# Altium footprint library PCBKU.PcbLib: 192 footprints (part 5 of 12)
Each footprint in its own frame and in the unit in brackets; x right, y up, seen from the top. Pads: shape width x height; smd on the part's side, far side on the other; paste and mask are expansions set on the pad; w line width, h text height; cw(c..) or ccw(c..) is an arc to the next point about the centre after c.
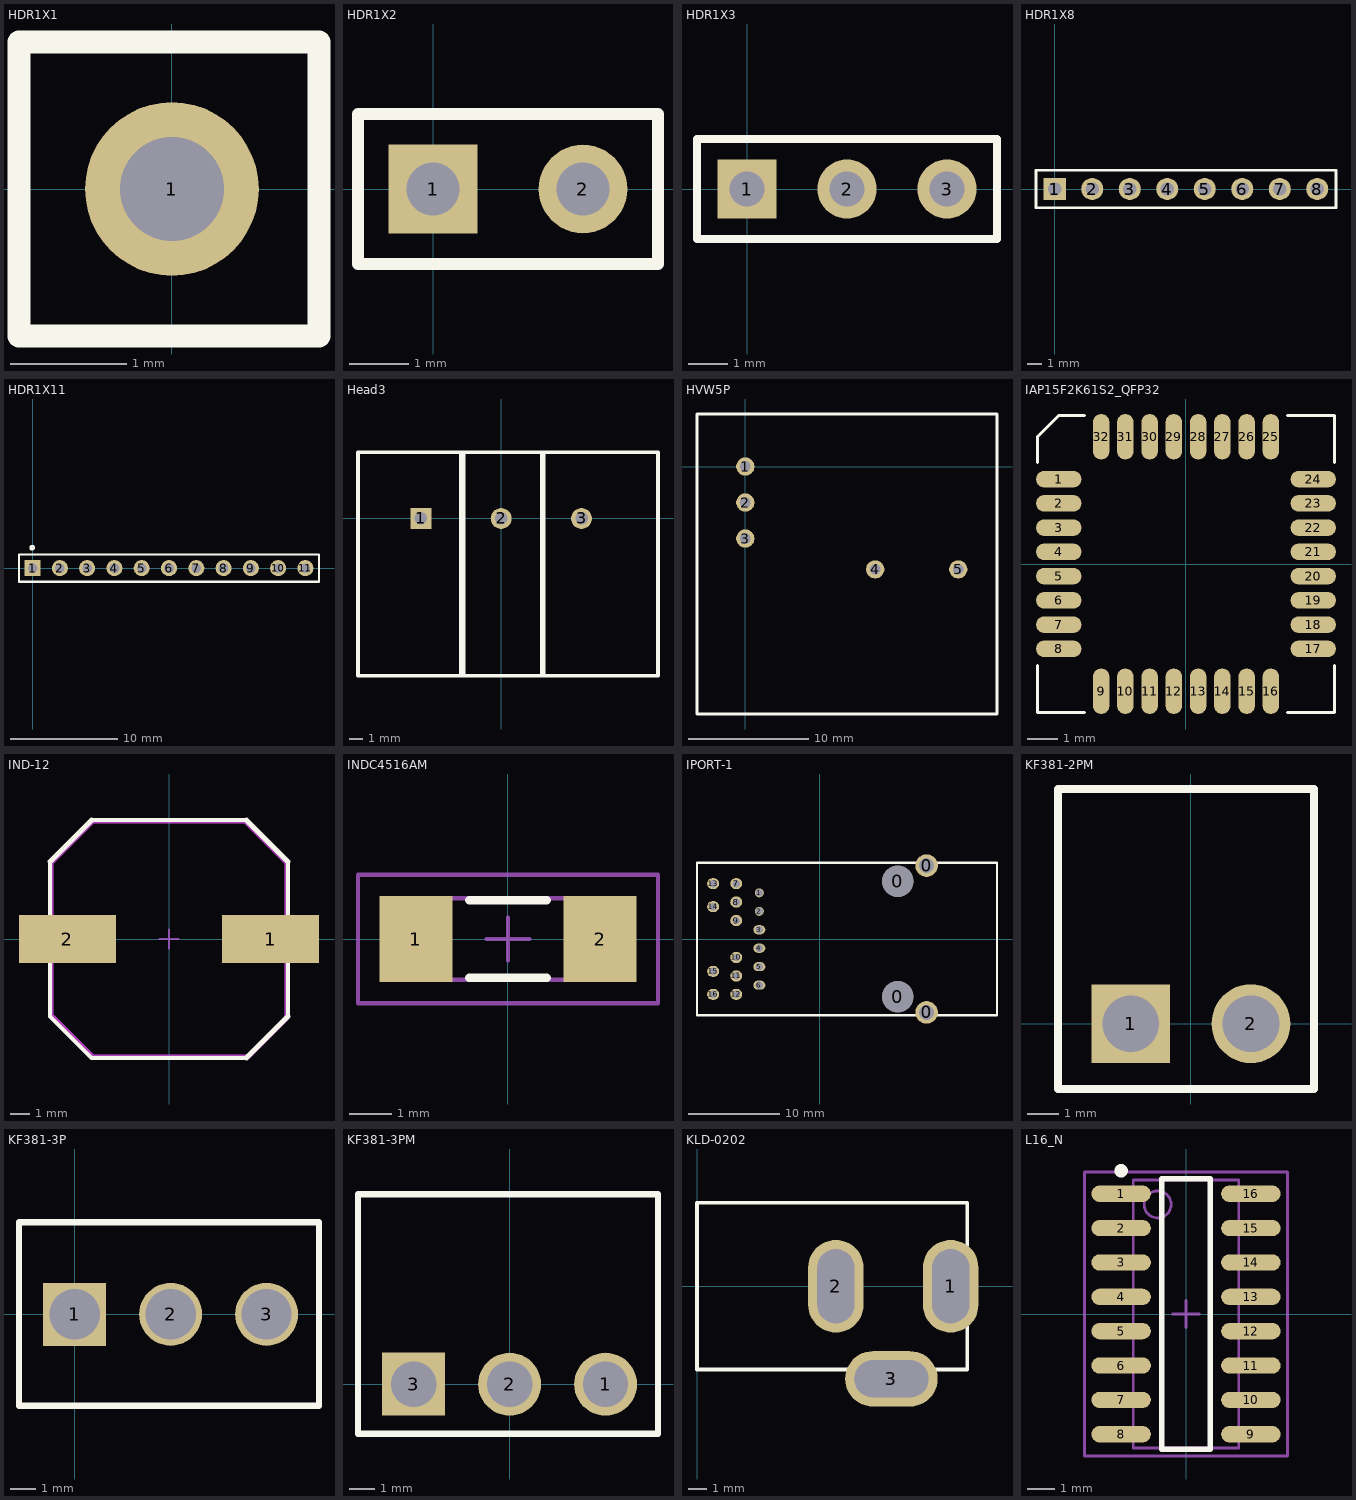
[diagram p4: the footprints below, top view; thin cyan lines are the x and y axes]

## HDR1X1 [mm]
pads (1):
  round 1.5 hole 0.9: 1(0,0)
Top Overlay:
  lines w0.2: -1.321,-1.27 1.27,-1.27 1.27,1.27 -1.321,1.27 -1.321,-1.27

## HDR1X2 [mm]
pads (2):
  rect 1.5x1.5 hole 0.9: 1(0,0)
  round 1.5 hole 0.9: 2(2.54,0)
Top Overlay:
  lines w0.2: -1.27,-1.27 3.81,-1.27 3.81,1.27 -1.27,1.27 -1.27,-1.27
3D body: height 8.55, standoff -2.45, extent -1.245,-1.128 3.835,1.372
3D body: height 9.05, standoff 2.55, extent -1.205,-1.128 3.795,1.222

## HDR1X3 [mm] "Connector; Header; 3 Position"
pads (3):
  rect 1.5x1.5 hole 0.9: 1(0,0)
  round 1.5 hole 0.9: 2(2.54,0) 3(5.08,0)
Top Overlay:
  lines w0.2: -1.27,-1.27 -1.27,1.27 6.35,1.27 6.35,-1.27 -1.27,-1.27

## HDR1X8 [mm] "Connector; Header; 8 Position"
pads (8):
  rect 1.5x1.5 hole 0.9: 1(0,0)
  round 1.5 hole 0.9: 2(2.54,0) 3(5.08,0) 4(7.62,0) 5(10.16,0) 6(12.7,0) 7(15.24,0) 8(17.78,0)
Top Overlay:
  lines w0.2: -1.27,-1.27 -1.27,1.27 19.05,1.27 19.05,-1.27 -1.27,-1.27

## HDR1X11 [mm] "Connector; Header; 11 Position"
pads (11):
  rect 1.5x1.5 hole 0.9: 1(0,0)
  round 1.5 hole 0.9: 2(2.54,0) 3(5.08,0) 4(7.62,0) 5(10.16,0) 6(12.7,0) 7(15.24,0) 8(17.78,0) 9(20.32,0) 10(22.86,0) 11(25.4,0)
Top Overlay:
  circle w0.254: c-0.041,1.9 r0.141
  lines w0.2: -1.27,-1.27 26.67,-1.27 26.67,1.27 0.635,1.27 -1.27,1.27 -1.27,-1.27
3D body: height 8.54, standoff -3, extent -1.27,-1.27 26.67,1.27

## Head3 [mm]
pads (3):
  rect 1.5x1.5 hole 0.9: 1(-5.76,0)
  round 1.5 hole 0.9: 2(0,0) 3(5.76,0)
Top Overlay:
  lines w0.254: -2.896,-11.252 -2.88,-11.268 -2.88,2.591 ; -2.88,-2.997 -2.88,2.591 ; -2.88,4.709 -2.88,2.591 ; -2.667,-11.227 -2.667,4.75 ; 2.896,-11.277 2.896,4.75 ; 3.048,-11.227 3.048,4.75 ; -10.26,-11.277 11.24,-11.277 11.24,4.75 -10.26,4.75 -10.26,-11.277

## HVW5P [mil]
pads (5):
  round 60 hole 35: 1(0,0) 2(0,-118.11) 3(0,-236.22) 4(426.18,-337.4) 5(698.62,-337.4)
Top Overlay:
  lines w10: -158.46,-811.81 825.79,-811.81 825.79,172.44 -158.46,172.44 -158.46,-811.81

## IAP15F2K61S2_QFP32 [mm]
pads (32):
  oval 1.5x0.55 smd: 1(-4.2,2.8) 2(-4.2,2) 3(-4.2,1.2) 4(-4.2,0.4) 5(-4.2,-0.4) 6(-4.2,-1.2) 7(-4.2,-2) 8(-4.2,-2.8) 17(4.2,-2.8) 18(4.2,-2) 19(4.2,-1.2) 20(4.2,-0.4) 21(4.2,0.4) 22(4.2,1.2) 23(4.2,2) 24(4.2,2.8)
  oval 0.55x1.5 smd: 9(-2.8,-4.2) 10(-2,-4.2) 11(-1.2,-4.2) 12(-0.4,-4.2) 13(0.4,-4.2) 14(1.2,-4.2) 15(2,-4.2) 16(2.8,-4.2) 25(2.8,4.2) 26(2,4.2) 27(1.2,4.2) 28(0.4,4.2) 29(-0.4,4.2) 30(-1.2,4.2) 31(-2,4.2) 32(-2.8,4.2)
Top Overlay:
  lines w0.1: -4.9,-3.35 -4.9,-4.9 -3.35,-4.9 ; -4.9,3.35 -4.9,4.2 -4.2,4.9 -3.35,4.9 ; 3.35,-4.9 4.9,-4.9 4.9,-3.35 ; 3.35,4.9 4.9,4.9 4.9,3.35

## IND-12 [mm]
pads (2):
  rect 5x2.5 smd: 1(5.25,0) 2(-5.25,0)
Top Overlay:
  lines w0.2: -6.15,4 -6.15,-4 -4,-6.15 4,-6.15 ; -4,6.15 4,6.15 ; 6.15,-4 6.15,4
  lines w0.254: -6.15,4 -4,6.15 ; 4,-6.15 6.15,-4 ; 4,6.15 6.15,4
Mechanical 1 keep-out:
  lines w0.254: -6.096,-3.937 -6.096,3.937 -3.937,6.096 3.937,6.096 5.969,4.064 6.096,3.937 6.096,-4.064 4.064,-6.096 -3.937,-6.096 -5.969,-4.064
Mechanical 15:
  lines w0.1: -0.5,0 0.5,0 ; 0,-0.5 0,0.5
3D body: height 4.5, standoff 0, extent -6.096,-6.096 6.223,6.223

## INDC4516AM [mm]
pads (2):
  rect 1.7x2 smd: 1(-2.15,0) 2(2.15,0)
Top Overlay:
  lines w0.2: -0.9,-0.9 0.9,-0.9 ; -0.9,0.9 0.9,0.9
Mechanical 13:
  lines w0.1: -2.4,-0.95 2.4,-0.95 2.4,0.95 -2.4,0.95 -2.4,-0.95
Mechanical 15:
  lines w0.1: -0.5,0 0.5,0 ; 0,-0.5 0,0.5 ; -3.5,-1.5 3.5,-1.5 3.5,1.5 -3.5,1.5 -3.5,-1.5
3D body: height 1.8, standoff 0, extent -2.4,-0.95 2.4,0.95

## IPORT-1 [mil]
height 43.31
pads (20):
  round 135 hole 135: 0(337.5,-250) 0(337.5,250)
  round 98 hole 65: 0(462.5,-318) 0(462.5,318)
  round 39.37 hole 31.5: 1(-262.5,200) 2(-262.5,120)
  oval 52x39.37 hole 32: 3(-262.5,40) 4(-262.5,-40) 5(-262.5,-120) 6(-262.5,-200)
  oval 52x48 hole 32: 7(-362.5,240) 8(-362.5,160) 9(-362.5,80) 10(-362.5,-80) 11(-362.5,-160) 12(-362.5,-240) 13(-462.5,240) 14(-462.5,140) 15(-462.5,-140) 16(-462.5,-240)
Top Overlay:
  lines w9.84: -532.5,-330 -532.5,330 767.5,330 767.5,-330 -532.5,-330
Bottom Overlay:
  text "10" at -334.65,-37.64 h39.37
  text "15" at -437.01,-92.76 h39.37
  text "16" at -437.01,-321.1 h39.37
  text "NC" at -145.67,-61.26 h39.37
  text "3" at -185.04,17.48 h39.37
  text "2" at -185.04,104.09 h39.37
  text "1" at -192.91,182.83 h39.37
  text "7" at -346.46,281.26 h39.37
  text "13" at -440.94,285.2 h39.37

## KF381-2PM [mm]
pads (2):
  rect 2.5x2.5 hole 1.8: 1(-1.905,0)
  round 2.5 hole 1.8: 2(1.905,0)
Top Overlay:
  lines w0.254: -4.216,-2.071 3.912,-2.071 3.912,7.442 -4.216,7.442 -4.216,-2.071
3D body: height 7.5, standoff -3.2, extent -4.331,-1.654 4.089,7.546

## KF381-3P [mm]
pads (3):
  rect 2.5x2.5 hole 2: 1(0,0)
  round 2.5 hole 2: 2(3.81,0) 3(7.62,0)
Top Overlay:
  lines w0.254: -2.21,-3.632 -2.21,3.658 9.703,3.658 9.703,-3.632 -2.21,-3.632

## KF381-3PM [mm]
pads (3):
  round 2.5 hole 1.8: 1(3.81,0) 2(0,0)
  rect 2.5x2.5 hole 1.8: 3(-3.81,0)
Top Overlay:
  lines w0.254: -6.02,-1.97 -6.02,7.544 5.893,7.544 5.893,-1.97 -6.02,-1.97
3D body: height 7.5, standoff -3.2, extent -6.191,-1.6 6.039,7.6

## KLD-0202 [mm]
pads (3):
  oval 3x5 hole 2 slot 4 at 90 deg: 1(13.7,0) 2(7.5,0)
  oval 5x3 hole 2 slot 4 at 0 deg: 3(10.5,-5)
Top Overlay:
  lines w0.2: 8.3,-4.5 0,-4.5 0,4.5 14.6,4.5 14.6,2.2 ; 12.7,-4.5 14.6,-4.5 14.6,-2.2
Mechanical 1:

## L16_N [mm] "SOIC, 16-Leads, Body 9.9x3.9mm, Pitch 1.27mm, IPC Medium Density"
height 1.75
pads (16):
  oval 2.2x0.6 smd: 1(-2.4,4.445) 2(-2.4,3.175) 3(-2.4,1.905) 4(-2.4,0.635) 5(-2.4,-0.635) 6(-2.4,-1.905) 7(-2.4,-3.175) 8(-2.4,-4.445) 9(2.4,-4.445) 10(2.4,-3.175) 11(2.4,-1.905) 12(2.4,-0.635) 13(2.4,0.635) 14(2.4,1.905) 15(2.4,3.175) 16(2.4,4.445)
Top Overlay:
  circle w0.25: c-2.4,5.295 r0.125
  lines w0.2: -0.9,-5 0.9,-5 0.9,5 -0.9,5 -0.9,-5
Mechanical 13:
  circle w0.1: c-1.05,4.05 r0.5
  lines w0.1: -1.95,-4.95 1.95,-4.95 1.95,4.95 -1.95,4.95 -1.95,-4.95
Mechanical 15:
  lines w0.1: -0.5,0 0.5,0 ; 0,-0.5 0,0.5 ; -3.75,-5.25 3.75,-5.25 3.75,5.25 -3.75,5.25 -3.75,-5.25
3D body: height 1.75, standoff 0, extent -1.95,-4.95 1.95,4.95